# Altium footprint library Metric_SMD.PcbLib: 185 footprints (part 9 of 12)
Each footprint in its own frame and in the unit in brackets; x right, y up, seen from the top. Pads: shape width x height; smd on the part's side, far side on the other; paste and mask are expansions set on the pad; w line width, h text height; cw(c..) or ccw(c..) is an arc to the next point about the centre after c.
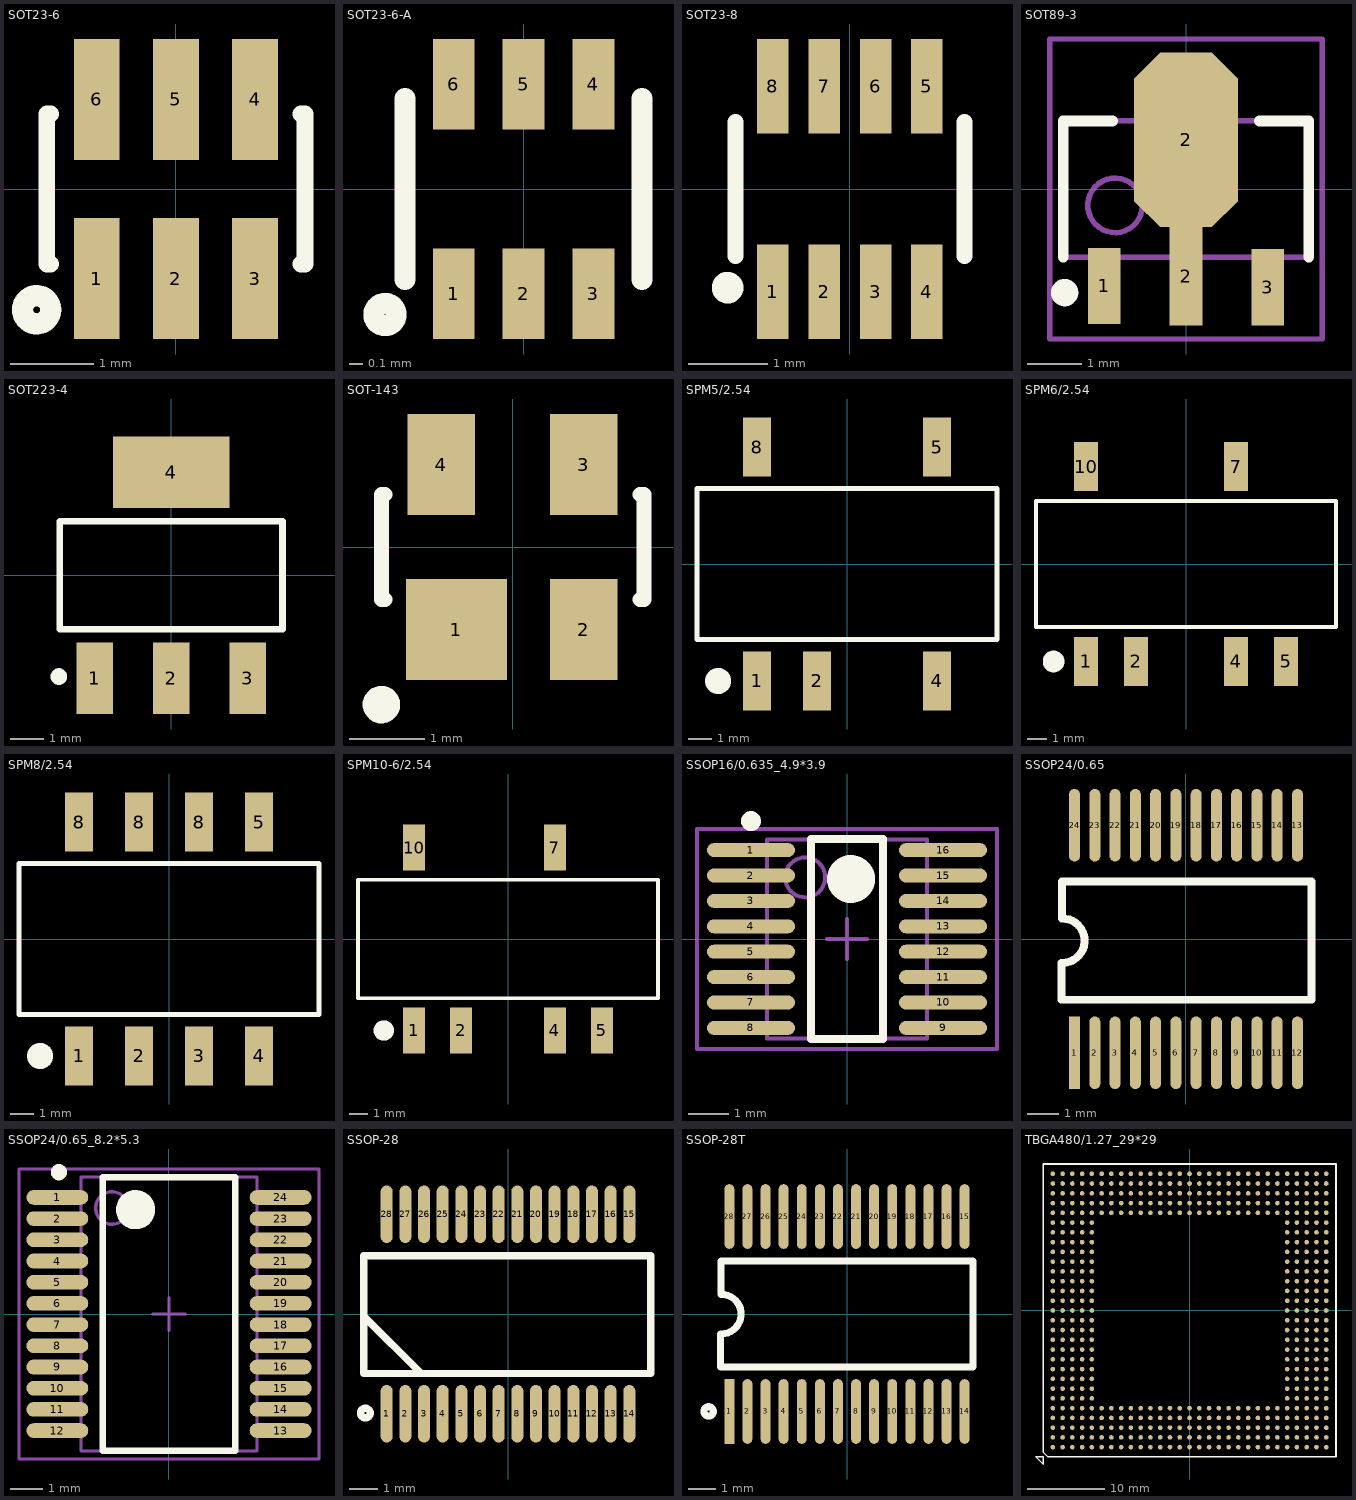
[diagram p8: the footprints below, top view; thin cyan lines are the x and y axes]

## SOT23-6 [mm] "SOT-23/SC-74A; 6 Leads; Body 3.1 x 3 mm, inc. leads (LxW max)"
height 1.45
pads (6):
  rect 0.55x1.45 smd: 1(-0.95,-1.075) 2(0,-1.075) 3(0.95,-1.075) 4(0.95,1.075) 5(0,1.075) 6(-0.95,1.075)
Top Overlay:
  circle w0.254: c-1.67,-1.449 r0.169
  lines w0.2: -1.5,-0.9 -1.55,-0.9 -1.55,0.9 -1.5,0.9 ; 1.5,-0.9 1.55,-0.9 1.55,0.9 1.5,0.9
3D body "User Library-SOT-23-6-1.STEP": height 1.45, standoff -0.01, extent -1.5,-1.5 1.5,1.5

## SOT23-6-A [mm] "SOT; 6Leads; Body 1.6x1.2mm"
height 0.6
pads (6):
  rect 0.3x0.65 smd: 1(-0.5,-0.75) 2(0,-0.75) 3(0.5,-0.75) 4(0.5,0.75) 5(0,0.75) 6(-0.5,0.75)
Top Overlay:
  circle w0.15: c-0.993,-0.9 r0.08
  lines w0.15: -0.85,-0.65 -0.85,0.65 ; 0.85,-0.65 0.85,0.65

## SOT23-8 [mm] "TSOT-23/SOT-23; 8Leads; Body 1.625 x 2.9mm"
height 1.45
pads (8):
  rect 0.4x1.2 smd: 1(-0.975,-1.3) 2(-0.325,-1.3) 3(0.325,-1.3) 4(0.975,-1.3) 5(0.975,1.3) 6(0.325,1.3) 7(-0.325,1.3) 8(-0.975,1.3)
Top Overlay:
  circle w0.2: c-1.549,-1.25 r0.1
  lines w0.2: -1.45,-0.85 -1.45,0.85 ; 1.45,-0.85 1.45,0.85

## SOT89-3 [mm] "SOT89(TO-243AA), 3-Leads, Body 4.5x2.5mm (max), Pitch 1.60mm, Lead Span 4.1mm, IPC Medium Density"
height 1.6
pads (4):
  rect 0.6x1.4 smd: 1(-1.5,-1.778) 3(1.5,-1.8)
  rect 0.6x1.8 smd: 2(0,-1.6)
  oct 1.9x3.2 smd: 2(0,0.9)
Top Overlay:
  circle w0.25: c-2.225,-1.9 r0.125
  lines w0.2: -2.25,-1.25 -2.25,1.25 -1.35,1.25 ; 1.35,1.25 2.25,1.25 2.25,-1.25
Mechanical 13:
  circle w0.1: c-1.3,-0.3 r0.5
  lines w0.1: -2.25,-1.25 2.25,-1.25 2.25,1.25 -2.25,1.25 -2.25,-1.25
Mechanical 15:
  lines w0.1: -0.5,0 0.5,0 ; 0,-0.5 0,0.5 ; -2.5,-2.75 2.5,-2.75 2.5,2.75 -2.5,2.75 -2.5,-2.75
3D body "SW3dPS-SOT89.STEP": height 1.6, standoff -0.01, extent -2.286,-2.159 2.314,2.091

## SOT223-4 [mm] "SOT-223/SC-73; 4 Leads; Body 6.7 x 7.3 mm, inc. leads (LxW max)"
height 1.8
pads (4):
  rect 1.1x2.15 smd: 1(-2.3,-3.1) 2(0,-3.1) 3(2.3,-3.1)
  rect 3.5x2.15 smd: 4(0,3.1)
Top Overlay:
  circle w0.25: c-3.376,-3.048 r0.125
  lines w0.2: -3.35,-1.625 3.35,-1.625 3.35,1.625 -3.35,1.625 -3.35,-1.625
3D body "User Library-SOT-223-2.STEP": height 1.85, standoff -0.05, extent -3.373,-3.678 3.327,3.526

## SOT-143 [mm] "典型MAX811封装"
height 1
pads (4):
  rect 1.35x1.35 smd: 1(-0.75,-1.1)
  rect 0.9x1.35 smd: 2(0.95,-1.1) 3(0.95,1.1) 4(-0.95,1.1)
Top Overlay:
  circle w0.25: c-1.75,-2.1 r0.125
  lines w0.2: -1.7,-0.7 -1.75,-0.7 -1.75,0.7 -1.7,0.7 ; 1.7,-0.7 1.75,-0.7 1.75,0.7 1.7,0.7

## SPM5/2.54 [mm]
height 6.25
pads (5):
  rect 1.2x2.5 smd: 1(-3.81,-4.95) 2(-1.27,-4.95) 4(3.81,-4.95) 5(3.81,4.95) 8(-3.81,4.95)
Top Overlay:
  circle w0.6: c-5.457,-4.953 r0.25
  lines w0.2: -6.35,-3.2 6.35,-3.2 6.35,3.2 -6.35,3.2 -6.35,-3.2
3D body: height 7, standoff 0.1, extent -6.248,-3.099 6.248,3.099

## SPM6/2.54 [mm] "SMD,Body 15.24*8.3"
height 7.25
pads (6):
  rect 1.2x2.5 smd: 1(-5.08,-4.95) 2(-2.54,-4.95) 4(2.54,-4.95) 5(5.08,-4.95) 7(2.54,4.95) 10(-5.08,4.95)
Top Overlay:
  circle w0.6: c-6.727,-4.953 r0.25
  lines w0.2: -7.62,-3.2 -7.62,3.2 7.62,3.2 7.62,-3.2 -7.62,-3.2
3D body: height 7.25, standoff 0.25, extent -7.612,-4.15 7.628,4.15

## SPM8/2.54 [mm]
height 6.25
pads (8):
  rect 1.2x2.5 smd: 1(-3.81,-4.95) 2(-1.27,-4.95) 3(1.27,-4.95) 4(3.81,-4.95) 5(3.81,4.95) 8(-3.81,4.95) 8(-1.27,4.95) 8(1.27,4.95)
Top Overlay:
  circle w0.6: c-5.457,-4.953 r0.25
  lines w0.2: -6.35,-3.2 -6.35,3.2 6.35,3.2 6.35,-3.2 -6.35,-3.2

## SPM10-6/2.54 [mm] "SMD,Body 16.24*8.0"
height 7.5
pads (6):
  rect 1.2x2.5 smd: 1(-5.08,-4.95) 2(-2.54,-4.95) 4(2.54,-4.95) 5(5.08,-4.95) 7(2.54,4.95) 10(-5.08,4.95)
Top Overlay:
  circle w0.6: c-6.727,-4.953 r0.25
  lines w0.2: -8.12,3.2 8.12,3.2 8.12,-3.2 -8.12,-3.2 -8.12,3.19 -8.11,3.2
3D body: height 7.25, standoff 0.25, extent -8.11,-4.15 8.12,4.15

## SSOP16/0.635_4.9*3.9 [mm] "SSOP; QSOP;16 Leads; Body Width 3.9 mm; Pitch 0.635 mm"
height 1.75
pads (16):
  oval 2.2x0.35 smd: 1(-2.4,2.223) 2(-2.4,1.588) 3(-2.4,0.953) 4(-2.4,0.318) 5(-2.4,-0.317) 6(-2.4,-0.952) 7(-2.4,-1.587) 8(-2.4,-2.222) 9(2.4,-2.222) 10(2.4,-1.587) 11(2.4,-0.952) 12(2.4,-0.317) 13(2.4,0.318) 14(2.4,0.953) 15(2.4,1.588) 16(2.4,2.223)
Top Overlay:
  circle w0.25: c-2.4,2.948 r0.125
  circle w0.6: c0.1,1.5 r0.3
  lines w0.2: -0.9,-2.5 -0.9,2.5 0.9,2.5 0.9,-2.5 -0.9,-2.5
Mechanical 13:
  circle w0.1: c-1.045,1.54 r0.5
  lines w0.1: -1.995,-2.49 -1.995,2.49 1.995,2.49 1.995,-2.49 -1.995,-2.49
Mechanical 15:
  lines w0.1: -0.5,0 0.5,0 ; 0,-0.5 0,0.5 ; -3.75,-2.75 -3.75,2.75 3.75,2.75 3.75,-2.75 -3.75,-2.75
3D body "SW3dPS-SSOP16.STEP": height -0.4, standoff -1.5, extent -3.001,-2.5 2.994,2.478

## SSOP24/0.65 [mm] "兼容TSSOP-24,0.65mm间距"
height 1.57
pads (24):
  rect 0.356x2.324 smd: 1(-3.575,-3.65)
  oval 0.356x2.324 smd: 2(-2.925,-3.65) 3(-2.275,-3.65) 4(-1.625,-3.65) 5(-0.975,-3.65) 6(-0.325,-3.65) 7(0.325,-3.65) 8(0.975,-3.65) 9(1.625,-3.65) 10(2.275,-3.65) 11(2.925,-3.65) 12(3.575,-3.65) 13(3.575,3.65) 14(2.925,3.65) 15(2.275,3.65) 16(1.625,3.65) 17(0.975,3.65) 18(0.325,3.65) 19(-0.325,3.65) 20(-0.975,3.65) 21(-1.625,3.65) 22(-2.275,3.65) 23(-2.925,3.65) 24(-3.575,3.65)
Top Overlay:
  lines w0.254: -3.999,-0.765 -3.999,-1.95 4.025,-1.95 4.025,1.85 -3.975,1.85 -3.975,0.655 cw(c-3.96,-0.055) -3.96,-0.765
3D body: height 1.2, standoff 0.2, extent -3.975,-2.85 4.125,2.85

## SSOP24/0.65_8.2*5.3 [mm] "SSOP, 24-Leads, Body Width 5.3mm,Body 8.4x5.4mm (max), Pitch 0.65mm, IPC Medium Density"
height 2
pads (24):
  oval 1.9x0.45 smd: 1(-3.425,3.575) 2(-3.425,2.925) 3(-3.425,2.275) 4(-3.425,1.625) 5(-3.425,0.975) 6(-3.425,0.325) 7(-3.425,-0.325) 8(-3.425,-0.975) 9(-3.425,-1.625) 10(-3.425,-2.275) 11(-3.425,-2.925) 12(-3.425,-3.575) 13(3.425,-3.575) 14(3.425,-2.925) 15(3.425,-2.275) 16(3.425,-1.625) 17(3.425,-0.975) 18(3.425,-0.325) 19(3.425,0.325) 20(3.425,0.975) 21(3.425,1.625) 22(3.425,2.275) 23(3.425,2.925) 24(3.425,3.575)
Top Overlay:
  circle w0.25: c-3.375,4.35 r0.125
  circle w0.6: c-1.025,3.2 r0.3
  lines w0.2: -2.025,-4.2 -2.025,4.2 2.025,4.2 2.025,-4.2 -2.025,-4.2
Mechanical 13:
  circle w0.1: c-1.75,3.25 r0.5
  lines w0.1: -2.7,-4.2 -2.7,4.2 2.7,4.2 2.7,-4.2 -2.7,-4.2
Mechanical 15:
  lines w0.1: -0.5,0 0.5,0 ; 0,-0.5 0,0.5 ; -4.6,-4.45 -4.6,4.45 4.6,4.45 4.6,-4.45 -4.6,-4.45
3D body: height 2, standoff 0.05, extent -2.7,-4.2 2.7,4.2

## SSOP-28 [mm] "0.65mm间距"
height 0.051
pads (28):
  oval 0.42x2 smd: 1(-4.225,-3.475) 2(-3.575,-3.475) 3(-2.925,-3.475) 4(-2.275,-3.475) 5(-1.625,-3.475) 6(-0.975,-3.475) 7(-0.325,-3.475) 8(0.325,-3.475) 9(0.975,-3.475) 10(1.625,-3.475) 11(2.275,-3.475) 12(2.925,-3.475) 13(3.575,-3.475) 14(4.225,-3.475) 15(4.225,3.475) 16(3.575,3.475) 17(2.925,3.475) 18(2.275,3.475) 19(1.625,3.475) 20(0.975,3.475) 21(0.325,3.475) 22(-0.325,3.475) 23(-0.975,3.475) 24(-1.625,3.475) 25(-2.275,3.475) 26(-2.925,3.475) 27(-3.575,3.475) 28(-4.225,3.475)
Top Overlay:
  circle w0.254: c-4.969,-3.45 r0.169
  lines w0.254: -5.025,-0.075 -3.025,-2.075 -2.925,-2.075 ; -5.025,-2.075 -5.025,2.025 4.975,2.025 4.975,-2.075 -5.025,-2.075
3D body: height 1.2, standoff 0.2, extent -4.825,-2.775 4.875,3.025

## SSOP-28T [mm] "兼容TSSOP-28,0.65mm间距"
height 1.57
pads (28):
  rect 0.356x2.324 smd: 1(-4.225,-3.5)
  oval 0.356x2.324 smd: 2(-3.575,-3.5) 3(-2.925,-3.5) 4(-2.275,-3.5) 5(-1.625,-3.5) 6(-0.975,-3.5) 7(-0.325,-3.5) 8(0.325,-3.5) 9(0.975,-3.5) 10(1.625,-3.5) 11(2.275,-3.5) 12(2.925,-3.5) 13(3.575,-3.5) 14(4.225,-3.5) 15(4.225,3.5) 16(3.575,3.5) 17(2.925,3.5) 18(2.275,3.5) 19(1.625,3.5) 20(0.975,3.5) 21(0.325,3.5) 22(-0.325,3.5) 23(-0.975,3.5) 24(-1.625,3.5) 25(-2.275,3.5) 26(-2.925,3.5) 27(-3.575,3.5) 28(-4.225,3.5)
Top Overlay:
  circle w0.254: c-4.97,-3.499 r0.169
  lines w0.254: -4.549,-0.715 -4.549,-1.9 4.519,-1.9 4.519,1.9 -4.525,1.9 -4.525,0.705 cw(c-4.51,-0.005) -4.51,-0.715
3D body: height 1.2, standoff 0.2, extent -4.625,-2.3 4.575,2.3

## TBGA480/1.27_29*29 [mm] "TBGA,480 Leads,Pitch=50mil (1.27mm),29行，29列"
pads (480):
  round 0.6 smd: A1(-17.78,-17.78) A2(-17.78,-16.51) A3(-17.78,-15.24) A4(-17.78,-13.97) A5(-17.78,-12.7) A6(-17.78,-11.43) A7(-17.78,-10.16) A8(-17.78,-8.89) A9(-17.78,-7.62) A10(-17.78,-6.35) A11(-17.78,-5.08) A12(-17.78,-3.81) A13(-17.78,-2.54) A14(-17.78,-1.27) A15(-17.78,0) A16(-17.78,1.27) A17(-17.78,2.54) A18(-17.78,3.81) A19(-17.78,5.08) A20(-17.78,6.35) A21(-17.78,7.62) A22(-17.78,8.89) A23(-17.78,10.16) A24(-17.78,11.43) A25(-17.78,12.7) A26(-17.78,13.97) A27(-17.78,15.24) A28(-17.78,16.51) A29(-17.78,17.78) AA1(7.62,-17.78) AA2(7.62,-16.51) AA3(7.62,-15.24) AA4(7.62,-13.97) AA5(7.62,-12.7) AA25(7.62,12.7) AA26(7.62,13.97) AA27(7.62,15.24) AA28(7.62,16.51) AA29(7.62,17.78) AB1(8.89,-17.78) AB2(8.89,-16.51) AB3(8.89,-15.24) AB4(8.89,-13.97) AB5(8.89,-12.7) AB25(8.89,12.7) AB26(8.89,13.97) AB27(8.89,15.24) AB28(8.89,16.51) AB29(8.89,17.78) AC1(10.16,-17.78) AC2(10.16,-16.51) AC3(10.16,-15.24) AC4(10.16,-13.97) AC5(10.16,-12.7) AC25(10.16,12.7) AC26(10.16,13.97) AC27(10.16,15.24) AC28(10.16,16.51) AC29(10.16,17.78) AD1(11.43,-17.78) AD2(11.43,-16.51) AD3(11.43,-15.24) AD4(11.43,-13.97) AD5(11.43,-12.7) AD25(11.43,12.7) AD26(11.43,13.97) AD27(11.43,15.24) AD28(11.43,16.51) AD29(11.43,17.78) AE1(12.7,-17.78) AE2(12.7,-16.51) AE3(12.7,-15.24) AE4(12.7,-13.97) AE5(12.7,-12.7) AE6(12.7,-11.43) AE7(12.7,-10.16) AE8(12.7,-8.89) AE9(12.7,-7.62) AE10(12.7,-6.35) AE11(12.7,-5.08) AE12(12.7,-3.81) AE13(12.7,-2.54) AE14(12.7,-1.27) AE15(12.7,0) AE16(12.7,1.27) AE17(12.7,2.54) AE18(12.7,3.81) AE19(12.7,5.08) AE20(12.7,6.35) AE21(12.7,7.62) AE22(12.7,8.89) AE23(12.7,10.16) AE24(12.7,11.43) AE25(12.7,12.7) AE26(12.7,13.97) AE27(12.7,15.24) AE28(12.7,16.51) AE29(12.7,17.78) AF1(13.97,-17.78) AF2(13.97,-16.51) AF3(13.97,-15.24) AF4(13.97,-13.97) AF5(13.97,-12.7) AF6(13.97,-11.43) AF7(13.97,-10.16) AF8(13.97,-8.89) AF9(13.97,-7.62) AF10(13.97,-6.35) AF11(13.97,-5.08) AF12(13.97,-3.81) AF13(13.97,-2.54) AF14(13.97,-1.27) AF15(13.97,0) AF16(13.97,1.27) AF17(13.97,2.54) AF18(13.97,3.81) AF19(13.97,5.08) AF20(13.97,6.35) AF21(13.97,7.62) AF22(13.97,8.89) AF23(13.97,10.16) AF24(13.97,11.43) AF25(13.97,12.7) AF26(13.97,13.97) AF27(13.97,15.24) AF28(13.97,16.51) AF29(13.97,17.78) AG1(15.24,-17.78) AG2(15.24,-16.51) AG3(15.24,-15.24) AG4(15.24,-13.97) AG5(15.24,-12.7) AG6(15.24,-11.43) AG7(15.24,-10.16) AG8(15.24,-8.89) AG9(15.24,-7.62) AG10(15.24,-6.35) AG11(15.24,-5.08) AG12(15.24,-3.81) AG13(15.24,-2.54) AG14(15.24,-1.27) AG15(15.24,0) AG16(15.24,1.27) AG17(15.24,2.54) AG18(15.24,3.81) AG19(15.24,5.08) AG20(15.24,6.35) AG21(15.24,7.62) AG22(15.24,8.89) AG23(15.24,10.16) AG24(15.24,11.43) AG25(15.24,12.7) AG26(15.24,13.97) AG27(15.24,15.24) AG28(15.24,16.51) AG29(15.24,17.78) AH1(16.51,-17.78) AH2(16.51,-16.51) AH3(16.51,-15.24) AH4(16.51,-13.97) AH5(16.51,-12.7) AH6(16.51,-11.43) AH7(16.51,-10.16) AH8(16.51,-8.89) AH9(16.51,-7.62) AH10(16.51,-6.35) AH11(16.51,-5.08) AH12(16.51,-3.81) AH13(16.51,-2.54) AH14(16.51,-1.27) AH15(16.51,0) AH16(16.51,1.27) AH17(16.51,2.54) AH18(16.51,3.81) AH19(16.51,5.08) AH20(16.51,6.35) AH21(16.51,7.62) AH22(16.51,8.89) AH23(16.51,10.16) AH24(16.51,11.43) AH25(16.51,12.7) AH26(16.51,13.97) AH27(16.51,15.24) AH28(16.51,16.51) AH29(16.51,17.78) AJ1(17.78,-17.78) AJ2(17.78,-16.51) AJ3(17.78,-15.24) AJ4(17.78,-13.97) AJ5(17.78,-12.7) AJ6(17.78,-11.43) AJ7(17.78,-10.16) AJ8(17.78,-8.89) AJ9(17.78,-7.62) AJ10(17.78,-6.35) AJ11(17.78,-5.08) AJ12(17.78,-3.81) AJ13(17.78,-2.54) AJ14(17.78,-1.27) AJ15(17.78,0) AJ16(17.78,1.27) AJ17(17.78,2.54) AJ18(17.78,3.81) AJ19(17.78,5.08) AJ20(17.78,6.35) AJ21(17.78,7.62) AJ22(17.78,8.89) AJ23(17.78,10.16) AJ24(17.78,11.43) AJ25(17.78,12.7) AJ26(17.78,13.97) AJ27(17.78,15.24) AJ28(17.78,16.51) AJ29(17.78,17.78) B1(-16.51,-17.78) B2(-16.51,-16.51) B3(-16.51,-15.24) B4(-16.51,-13.97) B5(-16.51,-12.7) B6(-16.51,-11.43) B7(-16.51,-10.16) B8(-16.51,-8.89) B9(-16.51,-7.62) B10(-16.51,-6.35) B11(-16.51,-5.08) B12(-16.51,-3.81) B13(-16.51,-2.54) B14(-16.51,-1.27) B15(-16.51,0) B16(-16.51,1.27) B17(-16.51,2.54) B18(-16.51,3.81) B19(-16.51,5.08) B20(-16.51,6.35) B21(-16.51,7.62) B22(-16.51,8.89) B23(-16.51,10.16) B24(-16.51,11.43) B25(-16.51,12.7) B26(-16.51,13.97) B27(-16.51,15.24) B28(-16.51,16.51) B29(-16.51,17.78) C1(-15.24,-17.78) C2(-15.24,-16.51) C3(-15.24,-15.24) C4(-15.24,-13.97) C5(-15.24,-12.7) C6(-15.24,-11.43) C7(-15.24,-10.16) C8(-15.24,-8.89) C9(-15.24,-7.62) C10(-15.24,-6.35) C11(-15.24,-5.08) C12(-15.24,-3.81) C13(-15.24,-2.54) C14(-15.24,-1.27) C15(-15.24,0) C16(-15.24,1.27) C17(-15.24,2.54) C18(-15.24,3.81) C19(-15.24,5.08) C20(-15.24,6.35) C21(-15.24,7.62) C22(-15.24,8.89) C23(-15.24,10.16) C24(-15.24,11.43) C25(-15.24,12.7) C26(-15.24,13.97) C27(-15.24,15.24) C28(-15.24,16.51) C29(-15.24,17.78) D1(-13.97,-17.78) D2(-13.97,-16.51) D3(-13.97,-15.24) D4(-13.97,-13.97) D5(-13.97,-12.7) D6(-13.97,-11.43) D7(-13.97,-10.16) D8(-13.97,-8.89) D9(-13.97,-7.62) D10(-13.97,-6.35) D11(-13.97,-5.08) D12(-13.97,-3.81) D13(-13.97,-2.54) D14(-13.97,-1.27) D15(-13.97,0) D16(-13.97,1.27) D17(-13.97,2.54) D18(-13.97,3.81) D19(-13.97,5.08) D20(-13.97,6.35) D21(-13.97,7.62) D22(-13.97,8.89) D23(-13.97,10.16) D24(-13.97,11.43) D25(-13.97,12.7) D26(-13.97,13.97) D27(-13.97,15.24) D28(-13.97,16.51) D29(-13.97,17.78) E1(-12.7,-17.78) E2(-12.7,-16.51) E3(-12.7,-15.24) E4(-12.7,-13.97) E5(-12.7,-12.7) E6(-12.7,-11.43) E7(-12.7,-10.16) E8(-12.7,-8.89) E9(-12.7,-7.62) E10(-12.7,-6.35) E11(-12.7,-5.08) E12(-12.7,-3.81) E13(-12.7,-2.54) E14(-12.7,-1.27) E15(-12.7,0) E16(-12.7,1.27) E17(-12.7,2.54) E18(-12.7,3.81) E19(-12.7,5.08) E20(-12.7,6.35) E21(-12.7,7.62) E22(-12.7,8.89) E23(-12.7,10.16) E24(-12.7,11.43) E25(-12.7,12.7) E26(-12.7,13.97) E27(-12.7,15.24) E28(-12.7,16.51) E29(-12.7,17.78) F1(-11.43,-17.78) F2(-11.43,-16.51) F3(-11.43,-15.24) F4(-11.43,-13.97) F5(-11.43,-12.7) F25(-11.43,12.7) F26(-11.43,13.97) F27(-11.43,15.24) F28(-11.43,16.51) F29(-11.43,17.78) G1(-10.16,-17.78) G2(-10.16,-16.51) G3(-10.16,-15.24) G4(-10.16,-13.97) G5(-10.16,-12.7) G25(-10.16,12.7) G26(-10.16,13.97) G27(-10.16,15.24) G28(-10.16,16.51) G29(-10.16,17.78) H1(-8.89,-17.78) H2(-8.89,-16.51) H3(-8.89,-15.24) H4(-8.89,-13.97) H5(-8.89,-12.7) H25(-8.89,12.7) H26(-8.89,13.97) H27(-8.89,15.24) H28(-8.89,16.51) H29(-8.89,17.78) J1(-7.62,-17.78) J2(-7.62,-16.51) J3(-7.62,-15.24) J4(-7.62,-13.97) J5(-7.62,-12.7) J25(-7.62,12.7) J26(-7.62,13.97) J27(-7.62,15.24) J28(-7.62,16.51) J29(-7.62,17.78) K1(-6.35,-17.78) K2(-6.35,-16.51) K3(-6.35,-15.24) K4(-6.35,-13.97) K5(-6.35,-12.7) K25(-6.35,12.7) K26(-6.35,13.97) K27(-6.35,15.24) K28(-6.35,16.51) K29(-6.35,17.78) L1(-5.08,-17.78) L2(-5.08,-16.51) L3(-5.08,-15.24) L4(-5.08,-13.97) L5(-5.08,-12.7) L25(-5.08,12.7) L26(-5.08,13.97) L27(-5.08,15.24) L28(-5.08,16.51) L29(-5.08,17.78) M1(-3.81,-17.78) M2(-3.81,-16.51) M3(-3.81,-15.24) M4(-3.81,-13.97) M5(-3.81,-12.7) M25(-3.81,12.7) M26(-3.81,13.97) M27(-3.81,15.24) M28(-3.81,16.51) M29(-3.81,17.78) N1(-2.54,-17.78) N2(-2.54,-16.51) N3(-2.54,-15.24) N4(-2.54,-13.97) N5(-2.54,-12.7) N25(-2.54,12.7) N26(-2.54,13.97) N27(-2.54,15.24) N28(-2.54,16.51) N29(-2.54,17.78) P1(-1.27,-17.78) P2(-1.27,-16.51) P3(-1.27,-15.24) P4(-1.27,-13.97) P5(-1.27,-12.7) P25(-1.27,12.7) P26(-1.27,13.97) P27(-1.27,15.24) P28(-1.27,16.51) P29(-1.27,17.78) R1(0,-17.78) R2(0,-16.51) R3(0,-15.24) R4(0,-13.97) R5(0,-12.7) R25(0,12.7) R26(0,13.97) R27(0,15.24) R28(0,16.51) R29(0,17.78) T1(1.27,-17.78) T2(1.27,-16.51) T3(1.27,-15.24) T4(1.27,-13.97) T5(1.27,-12.7) T25(1.27,12.7) T26(1.27,13.97) T27(1.27,15.24) T28(1.27,16.51) T29(1.27,17.78) U1(2.54,-17.78) U2(2.54,-16.51) U3(2.54,-15.24) U4(2.54,-13.97) U5(2.54,-12.7) U25(2.54,12.7) U26(2.54,13.97) U27(2.54,15.24) U28(2.54,16.51) U29(2.54,17.78) V1(3.81,-17.78) V2(3.81,-16.51) V3(3.81,-15.24) V4(3.81,-13.97) V5(3.81,-12.7) V25(3.81,12.7) V26(3.81,13.97) V27(3.81,15.24) V28(3.81,16.51) V29(3.81,17.78) W1(5.08,-17.78) W2(5.08,-16.51) W3(5.08,-15.24) W4(5.08,-13.97) W5(5.08,-12.7) W25(5.08,12.7) W26(5.08,13.97) W27(5.08,15.24) W28(5.08,16.51) W29(5.08,17.78) Y1(6.35,-17.78) Y2(6.35,-16.51) Y3(6.35,-15.24) Y4(6.35,-13.97) Y5(6.35,-12.7) Y25(6.35,12.7) Y26(6.35,13.97) Y27(6.35,15.24) Y28(6.35,16.51) Y29(6.35,17.78)
Top Overlay:
  lines w0.2: -19.053,-19.049 -19.964,-19.049 -19.965,-19.05 -19.05,-19.964 -19.05,-19.05 ; -19.05,-18.415 -19.05,19.05 19.05,19.05 19.05,-19.05 -18.415,-19.05 -19.05,-18.415
3D body: height 1, standoff 0.1, extent -18.952,-18.796 18.796,19.05
3D body: height 2, standoff 1, extent -15.833,-15.24 15.456,16.002